# Altium footprint library PCB封装库.PcbLib: 77 footprints (part 5 of 5)
Each footprint in its own frame and in the unit in brackets; x right, y up, seen from the top. Pads: shape width x height; smd on the part's side, far side on the other; paste and mask are expansions set on the pad; w line width, h text height; cw(c..) or ccw(c..) is an arc to the next point about the centre after c.
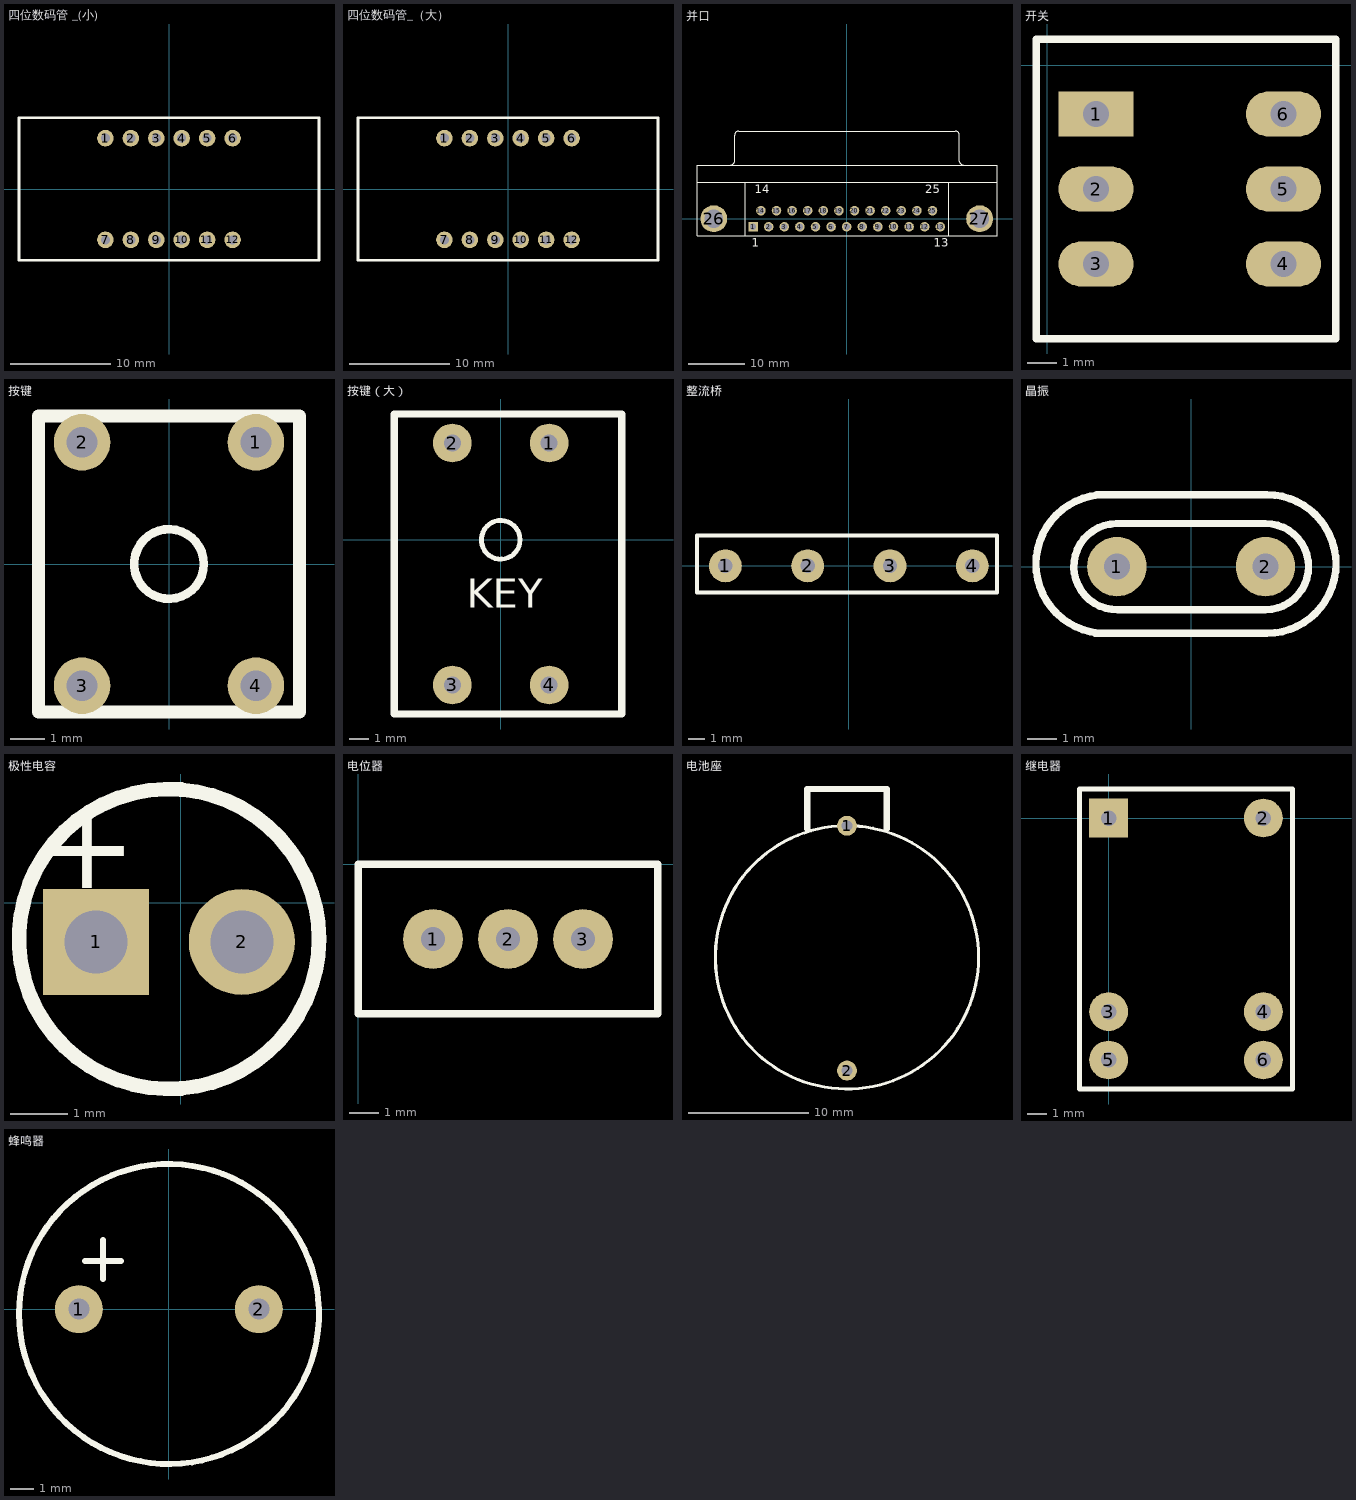
[diagram p4: the footprints below, top view; thin cyan lines are the x and y axes]

## 四位数码管 _(小) [mm]
pads (12):
  round 1.652 hole 0.9: 1(-6.35,5.08) 2(-3.81,5.08) 3(-1.27,5.08) 4(1.27,5.08) 5(3.81,5.08) 6(6.35,5.08) 7(-6.35,-5.08) 8(-3.81,-5.08) 9(-1.27,-5.08) 10(1.27,-5.08) 11(3.81,-5.08) 12(6.35,-5.08)
Top Overlay:
  lines w0.254: -14.732,-7.112 14.732,-7.112 14.986,-7.112 14.986,-6.604 14.986,7.112 -14.986,7.112 -14.986,-6.604 -14.986,-7.112 -14.478,-7.112

## 四位数码管_（大） [mm]
pads (12):
  round 1.652 hole 0.9: 1(-6.35,5.08) 2(-3.81,5.08) 3(-1.27,5.08) 4(1.27,5.08) 5(3.81,5.08) 6(6.35,5.08) 7(-6.35,-5.08) 8(-3.81,-5.08) 9(-1.27,-5.08) 10(1.27,-5.08) 11(3.81,-5.08) 12(6.35,-5.08)
Top Overlay:
  lines w0.254: -14.732,-7.112 14.732,-7.112 14.986,-7.112 14.986,-6.604 14.986,7.112 -14.986,7.112 -14.986,-6.604 -14.986,-7.112 -14.478,-7.112

## 并口 [mm]
pads (27):
  rect 1.69x1.69 hole 1.09: 1(-16.566,-1.42)
  round 1.69 hole 1.09: 2(-13.805,-1.42) 3(-11.044,-1.42) 4(-8.283,-1.42) 5(-5.522,-1.42) 6(-2.761,-1.42) 7(0,-1.42) 8(2.761,-1.42) 9(5.522,-1.42) 10(8.283,-1.42) 11(11.044,-1.42) 12(13.805,-1.42) 13(16.566,-1.42) 14(-15.185,1.42) 15(-12.424,1.42) 16(-9.663,1.42) 17(-6.902,1.42) 18(-4.141,1.42) 19(-1.38,1.42) 20(1.381,1.42) 21(4.142,1.42) 22(6.903,1.42) 23(9.664,1.42) 24(12.425,1.42) 25(15.186,1.42)
  round 4.76 hole 3.26: 26(-23.526,0) 27(23.526,0)
Top Overlay:
  lines w0.2: -26.496,6.5 26.604,6.5 ; -20.541,9.505 ccw(c-20.541,10.2) -19.846,10.2 -19.846,14.8 ; -19.841,14.805 cw(c-19.146,14.805) -19.146,15.5 19.254,15.5 cw(c19.254,14.805) 19.949,14.805 ; -17.946,-3 -17.946,6.5 ; 18.054,-3 18.054,6.5 ; 19.954,14.8 19.954,10.2 ccw(c20.649,10.2) 20.649,9.505 ; -26.496,-3 -26.496,9.5 26.604,9.5 26.604,-3 -26.496,-3
  text "25" at 13.936,4.525 h1.5
  text "14" at -16.31,4.525 h1.5
  text "13" at 15.441,-4.975 h1.5
  text "1" at -16.816,-4.975 h1.5

## 开关 [mil]
pads (6):
  rect 100x60 hole 35: 1(65,-65)
  oval 100x60 hole 35: 2(65,-165) 3(65,-265) 4(315,-265) 5(315,-165) 6(315,-65)
Top Overlay:
  lines w10: -15,-325 -15,-165 -15,-5 -15,35 20,35 385,35 ; -15,-317 -15,-365 5,-365 365,-365 385,-365 ; 5,35 365,35 354,35 ; 385,-15 385,35 ; 385,-5 385,-325 385,-365 ; 385,-365 385,35

## 按键 [mil]
pads (4):
  round 65.06 hole 35.43: 1(100,140) 2(-100,140) 3(-100,-140) 4(100,-140)
Top Overlay:
  circle w10: c-0.05,0 r40.05
  lines w15: -150,-170 -150,170 150,170 150,-170 -150,-170

## 按键（大） [mil]
pads (4):
  round 80 hole 35: 1(100,200) 2(-100,200) 3(-100,-300) 4(100,-300)
Top Overlay:
  circle w10: c-0.05,0 r40.05
  lines w15: -220,-360 -220,260 250,260 250,-360 -220,-360
  text "KEY" at -70,-140 h60

## 整流桥 [mil]
pads (4):
  round 80 hole 35: 1(-300,0) 2(-100,0) 3(100,0) 4(300,0)
Top Overlay:
  lines w10: -369,-65 -369,74 360,74 360,-65 -369,-65

## 晶振 [mil]
pads (2):
  round 80 hole 35: 1(-100,0) 2(100,0)
Top Overlay:
  lines w10: -129,-90 102,-90 ccw(c101.5,3.5) 102,97 -127,97 ; -115,-90 cw(c-115.5,3.5) -115,97 ; -101,58 ccw(c-100,0) -99,-58 100,-58 ccw(c100,0) 100,58 -101,58

## 极性电容 [mm]
pads (2):
  rect 1.85x1.85 hole 1.1: 1(-1.473,-0.686)
  round 1.85 hole 1.1: 2(1.067,-0.686)
Top Overlay:
  circle w0.254: c-0.203,-0.635 r2.615
  text "+" at -2.489,0.254 h1.5

## 电位器 [mil]
pads (3):
  round 80 hole 32: 1(100,-100) 2(200,-100) 3(300,-100)
Top Overlay:
  lines w10: 0,-200 0,0 400,0 400,-200 0,-200

## 电池座 [mil]
pads (2):
  round 65.06 hole 35.43 unplated: 1(-740,-605) 2(-740,-1405)
Top Overlay:
  circle w10: c-740,-1035 r430.12
  lines w20: -870,-615 -870,-485 -610,-485 -610,-615

## 继电器 [mil]
pads (6):
  rect 80x80 hole 32: 1(0,0)
  round 80 hole 32: 2(320,0) 3(0,-400) 4(320,-400) 5(0,-500) 6(320,-500)
Top Overlay:
  lines w10: -60,-560 380,-560 380,60 -60,60 -60,-560

## 蜂鸣器 [mil]
pads (2):
  round 80 hole 35 unplated: 1(-150,0) 2(150,0)
Top Overlay:
  lines w10: -140,80 -80,80 ; -110,50 -110,115 ; 250,0 cw(c0.13,-7.93) 250,0.13